# Altium footprint library PcbLib1.PcbLib: 6 footprints
Each footprint in its own frame and in the unit in brackets; x right, y up, seen from the top. Pads: shape width x height; smd on the part's side, far side on the other; paste and mask are expansions set on the pad; w line width, h text height; cw(c..) or ccw(c..) is an arc to the next point about the centre after c.
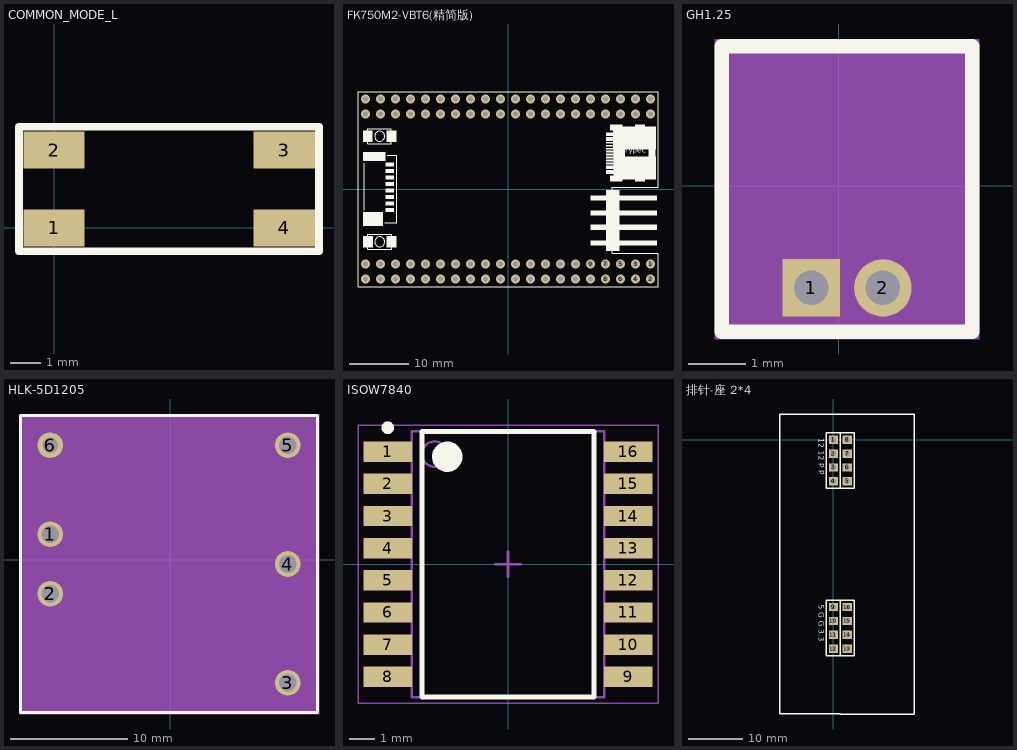
[diagram p0: the footprints below, top view; thin cyan lines are the x and y axes]

## COMMON_MODE_L [mm]
pads (4):
  rect 2x1.2 smd: 1(0,0) 2(0,2.54) 3(7.5,2.54) 4(7.5,0)
Top Overlay:
  lines w0.254: -1.143,-0.762 -1.143,3.302 8.636,3.302 8.636,-0.762 -1.143,-0.762

## FK750M2-VBT6(精简版) [mm]
pads (80):
  round 1.5 hole 0.9: 1(24.13,-12.7) 2(24.13,-15.24) 3(21.59,-12.7) 4(21.59,-15.24) 5(19.05,-12.7) 6(19.05,-15.24) 7(16.51,-12.7) 8(16.51,-15.24) 9(13.97,-12.7) 10(13.97,-15.24) 11(11.43,-12.7) 12(11.43,-15.24) 13(8.89,-12.7) 14(8.89,-15.24) 15(6.35,-12.7) 16(6.35,-15.24) 17(3.81,-12.7) 18(3.81,-15.24) 19(1.27,-12.7) 20(1.27,-15.24) 21(-1.27,-12.7) 22(-1.27,-15.24) 23(-3.81,-12.7) 24(-3.81,-15.24) 25(-6.35,-12.7) 26(-6.35,-15.24) 27(-8.89,-12.7) 28(-8.89,-15.24) 29(-11.43,-12.7) 30(-11.43,-15.24) 31(-13.97,-12.7) 32(-13.97,-15.24) 33(-16.51,-12.7) 34(-16.51,-15.24) 35(-19.05,-12.7) 36(-19.05,-15.24) 37(-21.59,-12.7) 38(-21.59,-15.24) 39(-24.13,-12.7) 40(-24.13,-15.24) 41(24.13,15.24) 42(24.13,12.7) 43(21.59,15.24) 44(21.59,12.7) 45(19.05,15.24) 46(19.05,12.7) 47(16.51,15.24) 48(16.51,12.7) 49(13.97,15.24) 50(13.97,12.7) 51(11.43,15.24) 52(11.43,12.7) 53(8.89,15.24) 54(8.89,12.7) 55(6.35,15.24) 56(6.35,12.7) 57(3.81,15.24) 58(3.81,12.7) 59(1.27,15.24) 60(1.27,12.7) 61(-1.27,15.24) 62(-1.27,12.7) 63(-3.81,15.24) 64(-3.81,12.7) 65(-6.35,15.24) 66(-6.35,12.7) 67(-8.89,15.24) 68(-8.89,12.7) 69(-11.43,15.24) 70(-11.43,12.7) 71(-13.97,15.24) 72(-13.97,12.7) 73(-16.51,15.24) 74(-16.51,12.7) 75(-19.05,15.24) 76(-19.05,12.7) 77(-21.59,15.24) 78(-21.59,12.7) 79(-24.13,15.24) 80(-24.13,12.7)
Top Overlay:
  circle w0.15: c-21.733,8.936 r0.85
  circle w0.15: c-21.721,-8.946 r0.85
  rectangle: 16.625,-10.484 18.911,-0.197
  rectangle: 13.958,-1.975 25.261,-1.086
  rectangle: 13.958,-4.515 25.261,-3.626
  rectangle: 13.958,-6.928 25.261,-6.039
  rectangle: 13.958,-9.595 25.261,-8.706
  rectangle: 16.561,8.947 17.958,9.582
  rectangle: 16.561,8.159 17.908,8.781
  rectangle: 16.561,3.359 17.908,3.981
  rectangle: 16.561,2.558 17.908,3.181
  rectangle: 16.561,7.677 17.857,7.981
  rectangle: 16.561,7.169 17.857,7.473
  rectangle: 16.561,6.673 17.857,6.978
  rectangle: 16.561,6.178 17.857,6.483
  rectangle: 16.561,5.67 17.857,5.975
  rectangle: 16.561,5.175 17.857,5.479
  rectangle: 16.561,4.667 17.857,4.971
  rectangle: 16.561,4.171 17.857,4.476
  rectangle: 17.819,6.673 25.045,10.559
  rectangle: 17.831,1.619 25.045,5.543
  rectangle: 17.831,5.352 19.825,6.978
  rectangle: 23.826,5.225 24.956,6.978
  rectangle: 21.54,1.238 23.165,2.368
  rectangle: 17.285,1.238 19.419,2.266
  rectangle: 21.54,9.928 23.165,10.915
  rectangle: 17.285,9.924 19.419,10.915
  rectangle: -20.777,-2.801 -19.265,-2.09
  rectangle: -20.777,-0.604 -19.278,0.107
  rectangle: -20.777,1.593 -19.265,2.304
  rectangle: -20.777,3.803 -19.265,4.502
  rectangle: -20.777,-3.893 -19.265,-3.195
  rectangle: -20.777,-1.696 -19.278,-0.998
  rectangle: -20.777,0.501 -19.265,1.2
  rectangle: -20.777,2.698 -19.265,3.409
  rectangle: -24.536,-6.268 -21.17,-3.906
  rectangle: -24.536,4.756 -20.777,6.254
  rectangle: -20.557,7.982 -18.906,9.887
  rectangle: -24.558,7.969 -22.907,9.887
  rectangle: -20.545,-9.899 -18.894,-7.994
  rectangle: -24.545,-9.912 -22.894,-7.994
  lines w0.1: -24.321,-3.576 -24.321,4.324 ; -20.848,-5.698 -18.843,-5.698 -18.843,5.696 -20.448,5.696
  lines w0.127: -23.733,7.686 -19.733,7.686 -19.733,10.186 -23.733,10.186 -23.733,7.686 ; -23.721,-10.196 -19.721,-10.196 -19.721,-7.696 -23.721,-7.696 -23.721,-10.196
  lines w0.152: -25.4,-16.51 -25.4,16.51 25.4,16.51 25.4,0.329 17.632,0.329 17.632,-10.847 25.4,-10.847 25.4,-16.51 -25.4,-16.51
  text "TypeC" at 19.698,5.809 h1.52
3D body "FK750M2-VBT6-V1.0.step": height 8.36, standoff 1.86, extent -25.4,-16.51 25.4,16.51

## GH1.25 [mm]
pads (2):
  rect 1x1 hole 0.6: 1(-0.482,-1.778)
  round 1 hole 0.6: 2(0.768,-1.778)
Top Overlay:
  lines w0.254: -2.032,-2.54 2.318,-2.54 2.318,2.422 -2.032,2.422 -2.032,-2.54
Mechanical 4:
  region: -2.159,2.549 2.445,2.549 2.445,-2.667 -2.159,-2.667
Mechanical 5:
  region: -0.982,-1.278 0.018,-1.278 0.018,-2.278 -0.982,-2.278
  region: 0.268,-1.278 1.268,-1.278 1.268,-2.278 0.268,-2.278
Mechanical 15:
  lines w0.003: 0.118,0.387 0.168,0.438

## HLK-5D1205 [mil]
pads (6):
  round 86.61 hole 59.06: 1(-405,85) 2(-405,-115) 3(395,-415) 4(395,-15) 5(395,385)
  round 86.61 hole 52: 6(-405,385)
Top Overlay:
  lines w10: -505,-515 -505,485 495,485 495,-515 -505,-515
Mechanical 4:
  region: -510,490 500,490 500,-520 -510,-520
Mechanical 5:
  region: 351.69,28.31 438.31,28.31 438.31,-58.31 351.69,-58.31
  region: 351.69,-371.69 438.31,-371.69 438.31,-458.31 351.69,-458.31
  region: 351.69,428.31 438.31,428.31 438.31,341.69 351.69,341.69
  region: -448.31,428.31 -361.69,428.31 -361.69,341.69 -448.31,341.69
  region: -448.31,-71.69 -361.69,-71.69 -361.69,-158.31 -448.31,-158.31
  region: -448.31,128.31 -361.69,128.31 -361.69,41.69 -448.31,41.69
Mechanical 15:
  lines w0.1: -6,2.75 -4,4.75

## ISOW7840 [mm] "SOIC, 16-Leads, Body 10.30x7.50mm, Pitch 1.27mm, IPC Medium Density"
height 2.65
pads (16):
  rect 1.9x0.8 smd: 1(-4.75,4.445) 2(-4.75,3.175) 3(-4.75,1.905) 4(-4.75,0.635) 5(-4.75,-0.635) 6(-4.75,-1.905) 7(-4.75,-3.175) 8(-4.75,-4.445) 9(4.75,-4.445) 10(4.75,-3.175) 11(4.75,-1.905) 12(4.75,-0.635) 13(4.75,0.635) 14(4.75,1.905) 15(4.75,3.175) 16(4.75,4.445)
Top Overlay:
  circle w0.6: c-2.4,4.25 r0.3
  circle w0.25: c-4.75,5.395 r0.125
  lines w0.2: -3.4,-5.25 3.4,-5.25 3.4,5.25 -3.4,5.25 -3.4,-5.25
Assembly Top:
  circle w0.1: c-2.9,4.35 r0.5
  lines w0.1: -3.8,-5.25 3.8,-5.25 3.8,5.25 -3.8,5.25 -3.8,-5.25
Courtyard Top:
  lines w0.05: -5.925,-5.5 5.925,-5.5 5.925,5.5 -5.925,5.5 -5.925,-5.5
  lines w0.1: -0.5,0 0.5,0 ; 0,-0.5 0,0.5
3D body: height 2.65, standoff 0.1, extent -3.8,-5.25 3.8,5.25

## 排针-座 2*4 [mil]
pads (16):
  rect 65x60 hole 40: 1(0,0) 2(0,-100) 3(0,-200) 4(0,-300) 5(100,-300) 6(100,-200) 7(100,-100) 8(100,0) 9(0,-1205) 10(0,-1305) 11(0,-1405) 12(0,-1505) 13(100,-1505) 14(100,-1405) 15(100,-1305) 16(100,-1205)
Top Overlay:
  lines w10: -384.96,-1974.92 -384.96,185.08 49.96,185.08 50,185.04 581.5,185.04 581.5,-1974.96 ; -384.92,-1974.96 50,-1974.96 50.04,-1975 581.54,-1975 ; 50,-1555 50,-1155 ; 50,-350 50,50 ; -50,-1555 -50,-1155 150,-1155 150,-1555 -50,-1555 ; -50,-350 150,-350 150,50 -50,50 -50,-350
  text "12 12 P P" at -105,10 h39.37
  text "5 G G 3.3" at -105,-1190 h39.37